# Altium integrated library GatewayRPICM5.IntLib: 39 symbols
Pins are listed as number, name and electrical type; pins without a type are passive.

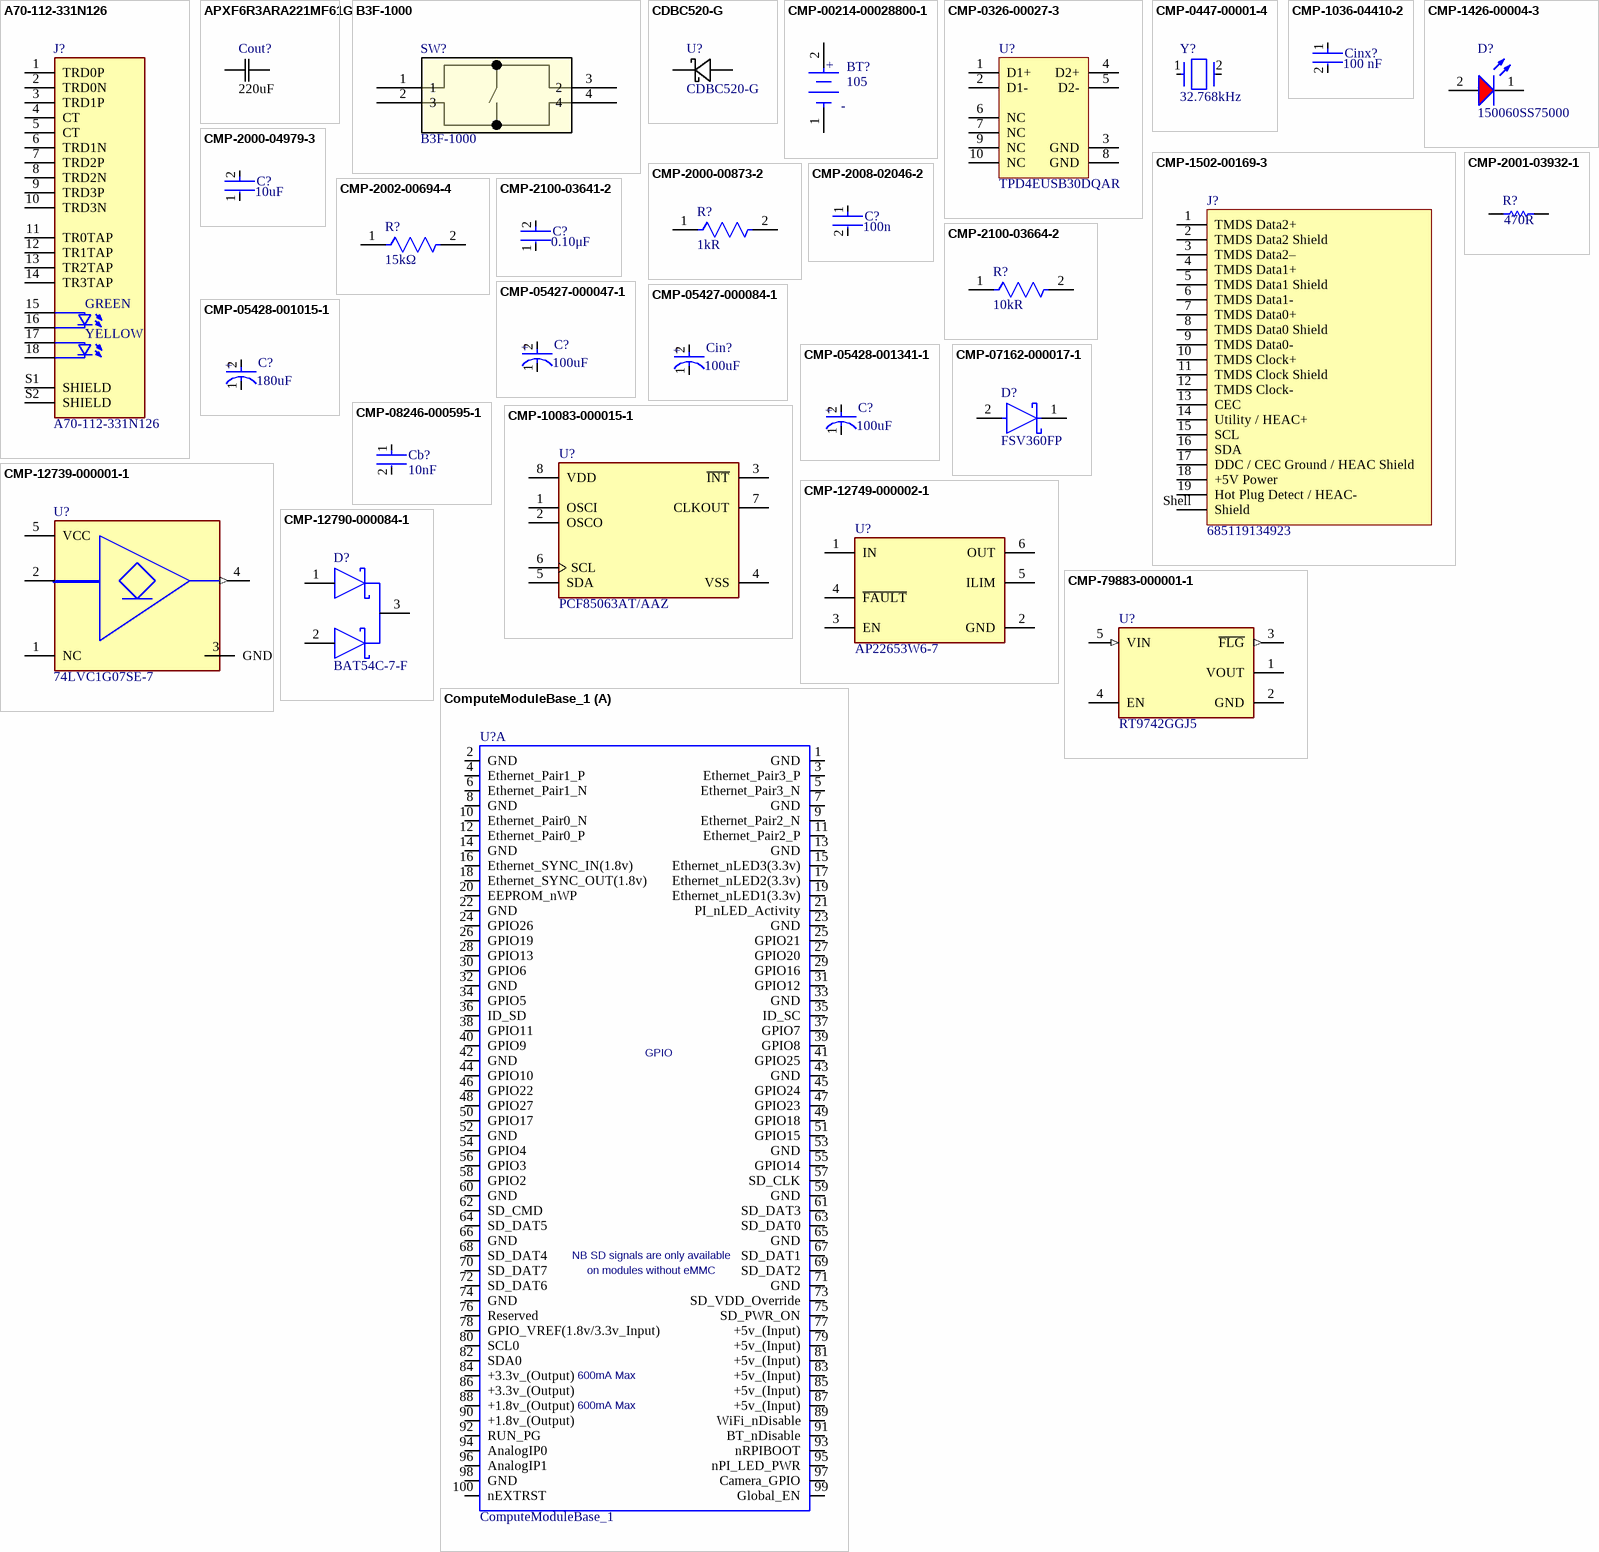
[diagram p0: symbols A70-112-331N126 to ComputeModuleBase_1]

## A70-112-331N126
designator J?
Ethernet RPI; Package: None; Availability: Unavailable; MP: A70-112-331N126; Value: *; Price: None
footprint EDAC_A70-112-331N126
pins: 1 TRD0P, 2 TRD0N, 3 TRD1P, 4 CT, 5 CT, 6 TRD1N, 7 TRD2P, 8 TRD2N, 9 TRD3P, 10 TRD3N, 11 TR0TAP, 12 TR1TAP, 13 TR2TAP, 14 TR3TAP, 15 Anode, 16 Cathode, 17 Anode, 18 Cathode, S1 SHIELD "Sheild", S2 SHIELD "Sheild"
text: GREEN; YELLOW

## APXF6R3ARA221MF61G
designator Cout?  value 220uF  (hidden comment: APXF6R3ARA221MF61G)
No Description Available; Mfr_Name: Nippon Chemi-Con
footprint CHEMI-F61
pins: 1, 2

## B3F-1000
designator SW?
No Description Available; Mfr_Name: Omron; RefDes: RefDes; Type: Type
footprint SW_B3F-1000_OMR
pins: 1, 2 3, 3 2, 4

## CDBC520-G
designator U?
No Description Available; Mfr_Name: Comchip
footprint CDBC-G
pins: 1, 2

## CMP-00214-00028800-1
designator BT?, comment 105
105 Battery Holder Coin Cell 1 Cell PC Pin PCB Through Hole Mount PBT 0.944 in. Dia; NexarPartId: 28800; Manufacturer: Keystone Electronics; Number of Contacts: 2; Number of Batteries: 1; Approvals: UL; Wire/Cable Gauge: 1AWG; Body Material: Glass, Nylon, PBT; Material: Plastic, Steel; REACH SVHC: No SVHC; Min Operating Temperature: -50°C; Lead Free: Lead Free; Height: 8.75mm; Diameter: 24mm; Termination: PC Pin; Max Operating Temperature: 145°C; Contact Material: Nickel; Number of Cells: 1; Packaging: Bulk; Contact Plating: Nickel; Mount: PCB, Through Hole; RoHS: Compliant; Manufacturer Part Number: 105
footprint FP-105-MFG (Battery Holder Coin Cell 1 Cell PC Pin PCB Through Hole Mount PBT 0.944 in. Dia)
pins: 1 -, 2 +

## CMP-0326-00027-3
designator U?, comment TPD4EUSB30DQAR
ESD Solution for Super-Speed (6 GBPS) USB 3.0 Interface, 4 Channels, -40 to +85 degC, 10-pin SON (DQA), Green (RoHS & no Sb/Br); Manufacturer: Texas Instruments; Differential Capacitance(pF): 0.05; Serial ATA / eSATA: TRUE; IO Capacitance(Typ)(pF): 0.8; IO Leakage Current(nA): 10; IEC 61000-4-2 Air-Gap(+/- kV): 8; ComponentLink3Description: URL Link1; PartNumber: TPD4EUSB30DQAR; DatasheetVersion: SLVSAC2C; ComponentLink2URL: http://www.ti.com/general/docs/lit/getliterature.tsp?genericPartNumber=TPD4EUSB30&fileType=pdf; USB Super Speed: TRUE; Eco-Plan: Green (RoHS & no Sb/Br); Mounting Technology: Surface Mount; 1394 / Firewire: TRUE; PackageVersion: revB, Sep-2009; SubFamily: ESD Solution; USB Full Speed: TRUE; USB High Speed: TRUE; ComponentLink2Description: Datasheet; ComponentLink1URL: http://www.ti.com/; IEC 61000-4-2 Contact(+/- kV): 8; Breakdown Voltage(Min)(V): 8; PackageReference: DQA0010A; ComponentLink1Description: Manufacturer URL; PackageDescription: 10-Pin Plastic Small Outline No-Lead, 1 x 2.5 x 0.55 mm Body, 0.5 mm Pitch; ComponentLink3URL: SamplesURL:http://www.ti.com/product/tpd4eusb30#samples; HDMI: TRUE; Manufacturer Part Number: TPD4EUSB30DQAR
footprint DQA0010A_V (SON, 10-Leads, Body 1x2.5mm, Pitch 0.5mm, TI Recommended)
pins: 1 D1+ "High-speed ESD clamp, provides ESD protection to the high-speed differential data line", 2 D1- "High-speed ESD clamp, provides ESD protection to the high-speed differential data line", 3 GND (power) "Ground", 4 D2+ "High-speed ESD clamp, provides ESD protection to the high-speed differential data line", 5 D2- "High-speed ESD clamp, provides ESD protection to the high-speed differential data line", 6 NC "Not normally connected", 7 NC "Not normally connected", 8 GND (power) "Ground", 9 NC "Not normally connected", 10 NC "Not normally connected"

## CMP-0447-00001-4
designator Y?, comment Frequency: 32.768kHz  (hidden comment: ABS07-32.768KHZ-T)
Crystal 32.768kHz ±20ppm (Tol) 12.5pF FUND 70kΩ 2-Pin CSMD T/R; Manufacturer: Abracon; ESR (Equivalent Series Resistance): 70kR; Radiation Hardening: No; Length: 3.2mm; Max Operating Temperature: 85°C; Number of Pins: 2; Series: ABS07; Min Operating Temperature: -40°C; Frequency Tolerance: 20ppm; Packaging: Tape and Reel; Height: 0.9mm; Width: 1.5mm; Depth: 1.5mm; Load Capacitance: 12.5pF; RoHS Compliant: Yes; Tolerance: 20ppm; Termination: SMD/SMT; Lead Free: Lead Free; Series Resistance: 70kR; REACH SVHC: No SVHC; Case/Package: CSMD; Operating Frequency: 32.768 kHz; Package Quantity: 3000; Manufacturer Part Number: ABS07-32.768KHZ-T
footprint FP-ABS07-MFG
pins: 1, 2

## CMP-1036-04410-2
designator Cinx?, comment value 100 nF  (hidden comment: CC0805KRX7R8BB104)
CAP CER 0.1UF 25V X7R 0805; Manufacturer: Yageo; Manufacturer: KEMET; Manufacturer Part Number: C0805C104K3RACTU; Manufacturer: Vishay Vitramon; Manufacturer Part Number: VJ0805Y104KXXMC; Manufacturer: Kyocera AVX; Manufacturer Part Number: 08053C104KAT2A; Manufacturer Part Number: C0805C104K3RACTM; Manufacturer Part Number: VJ0805Y104KXXAP; Manufacturer Part Number: C0805C104K3RAC; Manufacturer Part Number: VJ0805Y104KXXPW1BC; Manufacturer Part Number: VJ0805Y104KXXAC; Manufacturer: Murata; Manufacturer Part Number: GRM21BR71E104KA01L; Manufacturer: TDK; Manufacturer Part Number: C2012X7R1E104K/0.85; Manufacturer: Vishay; Manufacturer Part Number: VJ0805Y104KXXCW1BC; Manufacturer Part Number: C2012X7R1E104K/1.25; Manufacturer Part Number: 08053D104KAT2A; Manufacturer Part Number: 08053C104KAT7A; Manufacturer Part Number: CC0805KPX7R8BB104; Manufacturer Part Number: VJ0805Y104KXXMP; Manufacturer Part Number: 08053C104KAT4A; Tolerance: 0.1; ComponentLink2URL: http://www.yageo.com/documents/recent/UPY-GPHC_Y5V_6.3V-to-50V_8.pdf; Category: Cap; Mouser Description: Multilayer Ceramic Capacitors MLCC - SMD/SMT 100nF 25V X7R 10%; Manufacturer Part Number: CC0805KRX7R8BB104; Device Class L1: Passive Components; Footprint Url: http://www.yageo.com/exep/pages/download/literatures/UPY-C_GEN_24.pdf; Height: 0.95mm; Material: Ceramic; Digikey Description: CAP CER 0.1UF 25V X7R 0805; Lead Free: Yes; Temperature Range High: +85°C; Temperature: -30°C to +85°C; Ipc Land Pattern Name: CAPC200125X85; Capacitance: 100 nF; Automotive: No; Octopart: https://octopart.com/cc0805krx7r8bb104-yageo-39467766; Device Class L2: Capacitors; Temperature Characteristic: X7R; Voltage Rating: 25 V; ComponentLink2Description: Datasheet; Temperature Range Low: -30°C; Device Class L3: Ceramic Capacitors; RoHS: TRUE; Package: CC0805-0.85; Parameter 1: *
footprint FP-CC0805-0_85-MFG
footprint FP-CC0805-0_85-IPC_C
footprint FP-CC0805-0_85-IPC_B
footprint FP-CC0805-0_85-IPC_A
pins: 1, 2

## CMP-1426-00004-3
designator D?, comment 150060SS75000
Led, Red, 630 Nm, 1.9 V, 30 Ma, 60 Mcd Rohs Compliant: Yes; Manufacturer: Wurth Electronics; Dominant Wavelength: 630nm; Lens Style: Clear, Rectangular; Forward Current: 100mA; Test Current: 20mA; Viewing Angle: 140°; Forward Voltage: 1.9V; Peak Wavelength: 645nm; Max Reverse Voltage (DC): 5V; Luminous Intensity: 60mcd; Color: Red; Height: 700µm; Min Operating Temperature: -40°C; Case Code (Imperial): 0603; REACH SVHC: Unknown; RoHS: Compliant; Length: 1.6mm; Case Code (Metric): 1608; Mount: Surface Mount; Wavelength: 630nm; Packaging: Tape and Reel; Max Operating Temperature: 85°C; Width: 800µm; Case/Package: 0603; Manufacturer Part Number: 150060SS75000
footprint WL-SMCW_0603_150060xx75000
pins: 1 K, 2 A

## CMP-1502-00169-3
designator J?, comment 685119134923
NexarPartId: 18818285; Manufacturer: Wurth Electronics; Connector Type: HDMI; Contact Resistance: 30mΩ; Current Rating: 500mA; Gender: Receptacle; Insulation Resistance: 10MΩ; Number of Contacts: 19; Body Material: Plastic; Voltage Rating: 40V; REACH SVHC: Unknown; Length: 12.15mm; Orientation: Horizontal; Packaging: Tape and Reel; Number of Pins: 19; Min Operating Temperature: -25°C; Termination: SMD/SMT; Height: 5.55mm; Features: Shielded; Number of Positions: 19; Width: 15mm; Mount: Horizontal, Surface Mount; Color: Black; Contact Material: Bronze, Gold; RoHS: Compliant; Max Operating Temperature: 85°C; Manufacturer Part Number: 685119134923
footprint 685119134923 (Conn HDMI PL 19 POS 1.27mm Solder RA SMD 19 Terminal 1 Port T/R)
pins: 1 TMDS Data2+, 2 TMDS Data2 Shield, 3 TMDS Data2–, 4 TMDS Data1+, 5 TMDS Data1 Shield, 6 TMDS Data1-, 7 TMDS Data0+, 8 TMDS Data0 Shield, 9 TMDS Data0-, 10 TMDS Clock+, 11 TMDS Clock Shield, 12 TMDS Clock-, 13 CEC, 14 Utility / HEAC+, 15 SCL, 16 SDA, 17 DDC / CEC Ground / HEAC Shield, 18 +5V Power, 19 Hot Plug Detect / HEAC-, Shell Shield

## CMP-2000-00873-2
designator R?, comment Resistance: 1kR  (hidden comment: ERA-3AEB102V)
RES SMD 1K OHM 0.1% 1/10W 0603; Manufacturer: Panasonic; Temperature Coefficient: 25ppm/°C; Voltage Rating: 75V; Max Power Dissipation: 100mW; Technology: METAL FILM; Number of Pins: 2; Packaging: Tape and Reel; Case Code (Imperial): 0603; Case Code (Metric): 1608; Min Operating Temperature: -55°C; REACH SVHC: No SVHC; Length: 1.6mm; Termination: SMD/SMT; Depth: 0.8mm; Resistance Tolerance: 0.1%; Number of Terminations: 2; Width: 0.8mm; Military Standard: Not; Tolerance: 0.1%; Package Quantity: 5000; Contact Plating: Tin; Height: 0.45mm; Construction: Rectangular; Case/Package: 0603; Max Operating Temperature: 155°C; Resistor Type: Thin Film; Series: ERA-3A; Size Code: 0603; RoHS Compliant: Yes; Mount: Surface Mount; Radiation Hardening: No; Power Rating: 100mW; Manufacturer Part Number: ERA-3AEB102V
footprint FP-ERA3A-IPC_C
footprint FP-ERA3A-IPC_B
footprint FP-ERA3A-IPC_A
footprint FP-ERA3A-MFG
pins: 1, 2

## CMP-2000-04979-3
designator C?, comment Capacitance: 10uF  (hidden comment: C1608X5R1A106K080AC)
Multilayer Ceramic Capacitors 10μF ±10% 10V X5R SMD 0603; Manufacturer: TDK; Dielectric Material: Ceramic; Construction: Flat; Height: 0.8mm; Thickness: 0.035inch; Case Code (Metric): 1608; Radiation Hardening: No; Number of Pins: 2; Voltage Rating (DC): 10V; Depth: 0.8mm; Voltage: 10V; RoHS Compliant: Yes; Voltage Rating: 10V; Package Quantity: 1; Resistor Type: Ceramic; Termination: SMD/SMT; Lead Free: Lead Free; REACH SVHC: No SVHC; Tolerance: 10%; Mount: Surface Mount; Series: C; Packaging: Tape and Reel; Width: 0.8mm; Dielectric: X5R; Weight: 7.1E-05oz; Length: 1.6mm; Max Operating Temperature: 85°C; Case Code (Imperial): 0603; Case/Package: 0603; Min Operating Temperature: -55°C; Manufacturer Part Number: C1608X5R1A106K080AC
footprint FP-C1608-080-0_1-MFG
footprint FP-C1608-080-0_1-IPC_C
footprint FP-C1608-080-0_1-IPC_A
footprint FP-C1608-080-0_1-IPC_B
pins: 1, 2

## CMP-2001-03932-1
designator R?, comment value 470R  (hidden comment: CRCW0805470RFKEA)
Manufacturer: Vishay Dale; Manufacturer: Vishay; Part Number: CRCW0805470RFKEA; Manufacturer Part Number: CRCW0805470RFKEA
footprint RESC2013X50X30LL20T20 (Chip Resistor, 2-Leads, Body 2.00x1.25mm, IPC High Density)
footprint RESC2013X50X30NL20T20 (Chip Resistor, 2-Leads, Body 2.00x1.25mm, IPC Medium Density)
footprint RESC2013X50X30ML20T20 (Chip Resistor, 2-Leads, Body 2.00x1.25mm, IPC Low Density)
pins: 1, 2
1 alternate drawing of the same symbol

## CMP-2002-00694-4
designator R?, comment Resistance: 15kΩ  (hidden comment: ERJ-2RKF1502X)
RES SMD 15K OHM 1% 1/10W 0402; Manufacturer: Panasonic; Automotive Grade: Grade 0; Voltage Rating: 50V; Temperature Coefficient: 100ppm/°C; Power Rating: 0.1W; Value: 15kΩ; ComponentLink2URL: https://industrial.panasonic.com/cdbs/www-data/pdf/RDA0000/AOA0000C304.pdf; Automotive: Yes; Temperature: -55°C to +155°C; Height: 0.4mm; Digikey Description: RES SMD 15K OHM 1% 1/10W 0402; Category: Res; Device Class L2: Resistors; Device Class L1: Passive Components; Package: ERJ2R; Temperature Range Low: -55°C; Tolerance: 1%; Series: ERJ; Manufacturer Part Number: ERJ-2RKF1502X; Footprint Url: https://b2b-api.panasonic.eu/file_stream/pids/fileversion/1180; Mouser Description: Res Thick Film 1.0 x 0.5 mm 15K Ohm 1% 0.1W(1/10W) 100ppm/ C Molded SMD Punched Carrier T/R; Composition: Thick Film; Lead Free: Yes; Device Class L3: Chip SMD Resistors; Octopart: https://octopart.com/erj-2rkf1502x-panasonic-55404985; RoHS: TRUE; Temperature Range High: +155°C; ComponentLink2Description: Datasheet
footprint FP-ERJ2R-MFG
footprint FP-ERJ2R-IPC_C
footprint FP-ERJ2R-IPC_B
footprint FP-ERJ2R-IPC_A
pins: 1, 2

## CMP-2008-02046-2
designator C?, comment Capacitance: 100n  (hidden comment: C0402C104K8PACTU)
CAP CER 0.1UF 10V X5R 0402; Manufacturer: Kemet; Material: Ceramic; Temperature Coefficient: 15%; Tolerance: 0.1; Value: 0.10 μF; Package: C0402-BB; Temperature: -55°C to +125°C; ComponentLink2Description: Datasheet; Temperature Characteristic: X5R; Device Class L1: Passive Components; Height: 0.55mm; Lead Free: Yes; ComponentLink2URL: https://content.kemet.com/datasheets/KEM_C1002_X7R_SMD.pdf; Device Class L2: Capacitors; Temperature Range Low: -55°C; Temperature Range High: +125°C; RoHS: TRUE; Octopart: https://octopart.com/c0402c104k8pactu-kemet-140039; Automotive: No; Mouser Description: Capacitor 100 nF 10 VDC 0402; Category: Cap; Voltage Rating: 10 V; Digikey Description: CAP CER 0.1UF 10V X5R 0402; Ipc Land Pattern Name: CAPC10050X50; Device Class L3: Ceramic Capacitors; Manufacturer Part Number: C0402C104K8PACTU; Manufacturer: KEMET
footprint FP-C0402-BB-MFG
footprint FP-C0402-BB-IPC_C
footprint FP-C0402-BB-IPC_B
footprint FP-C0402-BB-IPC_A
pins: 1, 2

## CMP-2100-03641-2
designator C?, comment Capacitance: 0.10μF  (hidden comment: GRM155R71C104KA88D)
CAP CER 0.1UF 16V X7R 0402; Manufacturer: Murata; Standoff Height: 0mm; Tolerance: 10%; Voltage Rating: 16Vdc; Material: Ceramic; Value: 0.10μF; RoHS: TRUE; Manufacturer Part Number: GRM155R71C104KA88D; Temperature Characteristic: X7R; Octopart: https://octopart.com/grm155r71c104ka88d-murata-196880; Digikey Description: CAP CER 0.1UF 16V X7R 0402; Device Class L3: Ceramic Capacitors; Height: 0.55mm; ComponentLink2Description: Datasheet; Temperature Range Low: -55°C; Ipc Land Pattern Name: CAPC10050X219; ComponentLink2URL: https://search.murata.co.jp/Ceramy/image/img/A01X/G101/ENG/GRM155R71H471KA01-01A.pdf; Device Class L1: Passive Components; Lead Free: yes; Category: Cap; Package: GRM15; Temperature: -55°C to +125°C; Device Class L2: Capacitors; Temperature Range High: +125°C; Mouser Description: 0402 0.1 uF 16V ±10 % Tolerance X7R SMT Multilayer Ceramic Capacitor
footprint FP-GRM15-MFG
footprint FP-GRM15-IPC_C
footprint FP-GRM15-IPC_B
footprint FP-GRM15-IPC_A
pins: 1, 2

## CMP-2100-03664-2
designator R?, comment Resistance: 10kR  (hidden comment: RC0603FR-0710KL)
RES 10K OHM 1% 1/10W 0603; Manufacturer: Yageo; Voltage Rating: 75V; Voltage Rating (DC): 50V; Power Rating: 100mW; Temperature Coefficient: 100ppm/°C; Depth: 0.8mm; Termination: SMD/SMT; Resistor Type: Thick Film; Series: RC; Construction: Rectangular; Features: Moisture Resistant; Packaging: Tape and Reel; Min Operating Temperature: -55°C; Number of Terminations: 2; Lead Pitch: 0.3mm; RoHS Compliant: Yes; Case/Package: 0603; Resistance Tolerance: 1%; Military Standard: Not; Weight: 7.1E-05oz; Number of Pins: 2; Tolerance: 1%; Length: 1.6mm; Case Code (Imperial): 0603; Lead Free: Lead Free; Width: 0.8mm; Max Power Dissipation: 100mW; Height: 0.45mm; Max Operating Temperature: 155°C; Case Code (Metric): 1608; Size Code: 0603; Manufacturer Part Number: RC0603FR-0710KL
footprint FP-RC0603-0_55-IPC_C
footprint FP-RC0603-0_55-IPC_B
footprint FP-RC0603-0_55-MFG
footprint FP-RC0603-0_55-IPC_A
pins: 1, 2

## CMP-05427-000047-1
designator C?, comment Capacitance: 100uF  (hidden comment: EEE-1AA101WR)
CAP ALUM 100UF 20% 10V SMD; Manufacturer: Panasonic; Life (Hours): 1000Hour; Ripple Current: 50mA; Packaging: Tape and Reel; Diameter: 5mm; Voltage Rating (DC): 10V; Mount: Surface Mount; Max Operating Temperature: 85°C; Length: 5.5mm; Case/Package: Radial; Height: 5.4mm; Construction: Cylindrical; Termination: SMD/SMT; Height - Seated (Max): 0.213inch; Series: S; Min Operating Temperature: -40°C; Tolerance: 20%; Voltage Rating: 10V; Package Quantity: 1; Radiation Hardening: No; Ripple Current (AC): 50mA; Lead Free: Lead Free; RoHS Compliant: Yes; Contact Plating: Tin; Manufacturer Part Number: EEE-1AA101WR
footprint FP-SC-MFG
pins: 1 C, 2 A
text: +

## CMP-05427-000084-1
designator Cin?, comment Capacitance: 100uF  (hidden comment: EEE-FK1V101P)
CAP ALUM 100UF 20% 35V SMD; Manufacturer: Panasonic; Leakage Current: 3uA; ESR (Equivalent Series Resistance): 160mR; Ripple Current (AC): 600mA; Life (Hours): 2000Hour; Dielectric Material: Aluminium; RoHS Compliant: Yes; Construction: Cylindrical; REACH SVHC: No SVHC; Width: 10mm; Min Operating Temperature: -55°C; Voltage Rating (DC): 35V; Voltage: 35V; Impedance: 160mR; Ripple Current: 600mA; Lead Free: Lead Free; Packaging: Tape and Reel; Radiation Hardening: No; Mount: Surface Mount; Termination: SMD/SMT; Max Operating Temperature: 105°C; Package Quantity: 1; Length: 10.2mm; Contact Plating: Tin; Case/Package: Radial; Series: FK; Number of Pins: 2; Tolerance: 20%; Voltage Rating: 35V; Diameter: 8mm; Height: 10.2mm; Height - Seated (Max): 0.402inch; Manufacturer Part Number: EEE-FK1V101P
footprint FP-FKF-MFG
pins: 1 C, 2 A
text: +

## CMP-05428-001015-1
designator C?, comment Capacitance: 180uF  (hidden comment: 20SVPF180M)
Conductive Polymer Aluminum Solid Capacitors (OS-CON) 180uF ±20% 20V RADIAL SMT 8x6.9mm; Manufacturer: Panasonic; Polarity: Polar; Life (Hours): 5000Hour; Leakage Current: 720uA; Dissipation Factor: 12%; Ripple Current (AC): 3.2A; ESR (Equivalent Series Resistance): 25mR; Voltage: 20V; Height: 6.9mm; Length: 6.9mm; Number of Pins: 7; Packaging: Tape and Reel; Mount: Surface Mount; Lead Free: Lead Free; Max Operating Temperature: 105°C; Voltage Rating: 20V; Construction: Cylindrical; REACH SVHC: No SVHC; Diameter: 8mm; Tolerance: 20%; Package Quantity: 1000; Voltage Rating (DC): 20V; Series: OS-CON™, SVPF; Termination: SMD/SMT; Min Operating Temperature: -55°C; Ripple Current: 3.2A; RoHS Compliant: Yes; Case/Package: Radial; Height - Seated (Max): 0.276inch; Manufacturer Part Number: 20SVPF180M
footprint FP-OS-CON-SMT-E7-MFG
pins: 1 C, 2 A
text: +

## CMP-05428-001341-1
designator C?, comment Capacitance: 100uF  (hidden comment: 8TPE100MAZB)
Molded Tantalum Polymer Capacitor 100uF 20% 8V life 1000Hours SMD 1411; Manufacturer: Panasonic; Ripple Current: 1.4A; Polarity: Polar; ESR (Equivalent Series Resistance): 35mR; Leakage Current: 80uA; Dissipation Factor: 8%; Number of Pins: 2; Mount: Surface Mount; Lead Free: Lead Free; Min Operating Temperature: -55°C; Height - Seated (Max): 0.079inch; Tolerance: 20%; Voltage Rating (DC): 8V; Series: POSCAP™ TPE; RoHS Compliant: Yes; Features: General Purpose; Length: 3.5mm; Depth: 2.8mm; Termination: SMD/SMT; Height: 1.9mm; Radiation Hardening: No; Width: 2.8mm; Voltage Rating: 8V; Construction: Flat; Case/Package: Molded; Package Quantity: 2000; Voltage: 8V; Max Operating Temperature: 105°C; Case Code (Imperial): 1210; Case Code (Metric): 3528; Packaging: Tape and Reel; REACH SVHC: No SVHC; Manufacturer Part Number: 8TPE100MAZB
footprint FP-POSCAP-B2-MFG
pins: 1 C, 2 A
text: +

## CMP-07162-000017-1
designator D?, comment FSV360FP
DIODE SCHOTTKY 60V 3A SOD123HE; Manufacturer: ON Semiconductor; Manufacturer: ON Semiconductor / Fairchild; Peak Reverse Current: 100uA; Max Surge Forward Current: 80A; Max Junction Temp: +150°C; ComponentLink2URL: https://www.onsemi.jp/PowerSolutions/document/FSV360FP-D.PDF; Device Class L1: Discrete Semiconductors; RoHS: TRUE; Temperature: -55°C to +150°C; ComponentLink2Description: Datasheet; Manufacturer Part Number: FSV360FP; Height: 1mm; Octopart: https://octopart.com/fsv360fp-on+semiconductor-84328668; Device Class L2: Diodes; Forward Current: 3A; Automotive: No; Device Class L3: Schottky Diodes; Reverse Voltage: 60V; Digikey Description: DIODE SCHOTTKY 60V 3A SOD123HE; Footprint Url: https://www.onsemi.com/pub/Collateral/425AC.PDF; Package: 425AC; Mouser Description: 60V 3A Schottky Barrier Rectifier in SOD-123HE / TAPE REEL; Max Repetitive Reverse Voltage: 60V; Category: Diode; Lead Free: Yes; Temperature Range High: +150°C; Temperature Range Low: -55°C
footprint FP-425AC-MFG
pins: 1 C, 2 A

## CMP-08246-000595-1
designator Cb?, comment Capacitance: 10nF  (hidden comment: CGA4C2C0G1H103J060AA)
Cap Ceramic 10nF 50V C0G 5% Pad SMD 0805 +125°C Automotive T/R; Manufacturer: TDK; Max Operating Temperature: 125°C; Voltage Rating (DC): 50V; Packaging: Tape and Reel; Composition: Ceramic; Case/Package: 0805; REACH SVHC: No SVHC; Dielectric: C0G; Depth: 1.25mm; Min Operating Temperature: -55°C; Termination: SMD/SMT; Length: 2mm; Case Code (Metric): 2012; Thickness: 0.028inch; Ratings: AEC-Q200; Package Quantity: 1; Case Code (Imperial): 0805; Tolerance: 5%; Voltage Rating: 50V; Radiation Hardening: No; Lead Free: Lead Free; Height: 0.6mm; Mount: Surface Mount; Weight: 0.000194oz; Width: 0.049inch; Manufacturer Part Number: CGA4C2C0G1H103J060AA
footprint FP-CGA4J-IPC_B
footprint FP-CGA4J-IPC_C
footprint FP-CGA4J-IPC_A
footprint FP-CGA4J-MFG
pins: 1, 2

## CMP-10083-000015-1
designator U?, comment PCF85063AT/AAZ
IC RTC CLK/CALENDAR I2C 8SOIC; Manufacturer: NXP Semiconductors; Date Format: YY-MM-DD-dd; Time Format: HH:MM:SS (12/24 hr); RoHS Compliant: Yes; Interface: I2C; Mount: Surface Mount; Min Operating Temperature: -40°C; Lead Free: Lead Free; Packaging: Tape and Reel; Max Operating Temperature: 85°C; Case/Package: SOIC; Manufacturer Part Number: PCF85063AT/AAZ
footprint FP-SOT96-1-MFG
footprint FP-SOT96-1-IPC_B
footprint FP-SOT96-1-IPC_C
footprint FP-SOT96-1-IPC_A
pins: 1 OSCI, 2 OSCO, 3 ~{INT}, 4 VSS (power), 5 SDA, 6 SCL, 7 CLKOUT, 8 VDD (power)

## CMP-12739-000001-1
designator U?, comment 74LVC1G07SE-7
IC BUF NON-INVERT 5.5V SOT353; Manufacturer: Diodes Inc.; Manufacturer: Diodes; Number Of Outputs: 1; Standoff Height: 0mm; Propagation Delay: 1.7ns; Nominal Supply Current: 0.1uA; Min Supply Voltage: 1.65V; Max Junction Temp: +150°C; Logic Function Desc: Non-Inverting; Temperature: -40°C to +125°C; RoHS: TRUE; ComponentLink2Description: Datasheet; Category: IC; Ipc Land Pattern Name: SOT65P210X100-5; Digikey Description: IC BUF NON-INVERT 5.5V SOT353; Device Class L2: Logic ICs; Number Of Inputs: 1; Height: 1.1mm; Ambient Temperature Range High: +125°C; Lead Free: Yes; Octopart: https://octopart.com/74lvc1g07se-7-diodes+inc.-18882698; Device Class L1: Integrated Circuits (ICs); Number Of Circuits: 1; Max Supply Voltage: 5.5V; Temperature Range Low: -40°C; Manufacturer Part Number: 74LVC1G07SE-7; Device Class L3: Buffers; ComponentLink2URL: https://www.diodes.com/assets/Datasheets/74LVC1G07.pdf; Footprint Url: https://www.diodes.com/assets/Package-Files/SOT353.pdf; Temperature Range High: +125°C; Package: SOT353; Mouser Description: 74LVC Series 5.5 V Surface Mount Single Buffer with Open Drain Output - SOT-353; Automotive: No; Ambient Temperature Range Low: -40°C
footprint FP-SOT353-MFG
footprint FP-SOT353-IPC_C
footprint FP-SOT353-IPC_B
footprint FP-SOT353-IPC_A
pins: 1 NC, 2 A, 3 GND (power), 4 Y (out), 5 VCC (power)

## CMP-12749-000002-1
designator U?, comment AP22653W6-7
LOAD SWITCH,SOT26,T&R,3K; Manufacturer: Diodes; Manufacturer Part Number: AP22653W6-7
footprint FP-SOT26-MFG
footprint FP-SOT26-IPC_C
footprint FP-SOT26-IPC_B
footprint FP-SOT26-IPC_A
pins: 1 IN (power), 2 GND (power), 3 EN, 4 ~{FAULT} (oc), 5 ILIM, 6 OUT

## CMP-12790-000084-1
designator D?, comment BAT54C-7-F
DIODE ARRAY SCHOTTKY 30V SOT23-3; Manufacturer: Diodes; Max Reverse Current: 2uA; Power Dissipation: 200mW; Average Rectified Current: 200mA; Capacitance: 10pF; Peak Non-Repetitive Surge Current: 600mA; Forward Voltage: 800mV; Reverse Recovery Time: 5ns; Element Configuration: Common Cathode; Max Operating Temperature: 150°C; Max Reverse Voltage (DC): 30V; Power Rating: 200mW; Termination: SMD/SMT; REACH SVHC: No SVHC; Voltage Rating (DC): 30V; Series: -; Current Rating: 200mA; RoHS Compliant: Yes; Max Power Dissipation: 200mW; Case/Package: SOT-23; Max Repetitive Reverse Voltage (Vrrm): 30V; Width: 1.3mm; Min Operating Temperature: -65°C; Lead Free: Lead Free; Forward Current: 200mA; Number of Pins: 3; Contact Plating: Tin; Package Quantity: 3000; Length: 2.9mm; Radiation Hardening: No; Max Forward Surge Current (Ifsm): 600mA; Height: 1mm; Packaging: Tape and Reel; Mount: Surface Mount; Weight: 0.000282oz; Manufacturer Part Number: BAT54C-7-F
footprint FP-SOT23-IPC_B
footprint FP-SOT23-IPC_A
footprint FP-SOT23-IPC_C
footprint FP-SOT23-MFG
pins: 1 1 ANODE, 2 2 ANODE, 3 COMMON CATHODE

## CMP-79883-000001-1
designator U?, comment RT9742GGJ5
IC PWR SWTCH N-CHAN 1:1 TSOT23-5; Manufacturer: Richtek; Interface: On/Off; Fault Protection: Over Temperature; Max Output Current: 1A; Number of Outputs: 1; Output Configuration: High Side; On-State Resistance: 70mR; REACH SVHC: No SVHC; Number of Pins: 23; Packaging: Tape and Reel; Case/Package: SOT-23-5; RoHS Compliant: Yes; Max Operating Temperature: 85°C; Min Operating Temperature: -40°C; Manufacturer Part Number: RT9742GGJ5
footprint FP-RT9742GGJ5-IPC_C
footprint FP-RT9742GGJ5-IPC_B
footprint FP-RT9742GGJ5-IPC_A
pins: 1 VOUT (power), 2 GND (power), 3 ~{FLG} (out), 4 EN, 5 VIN (in)

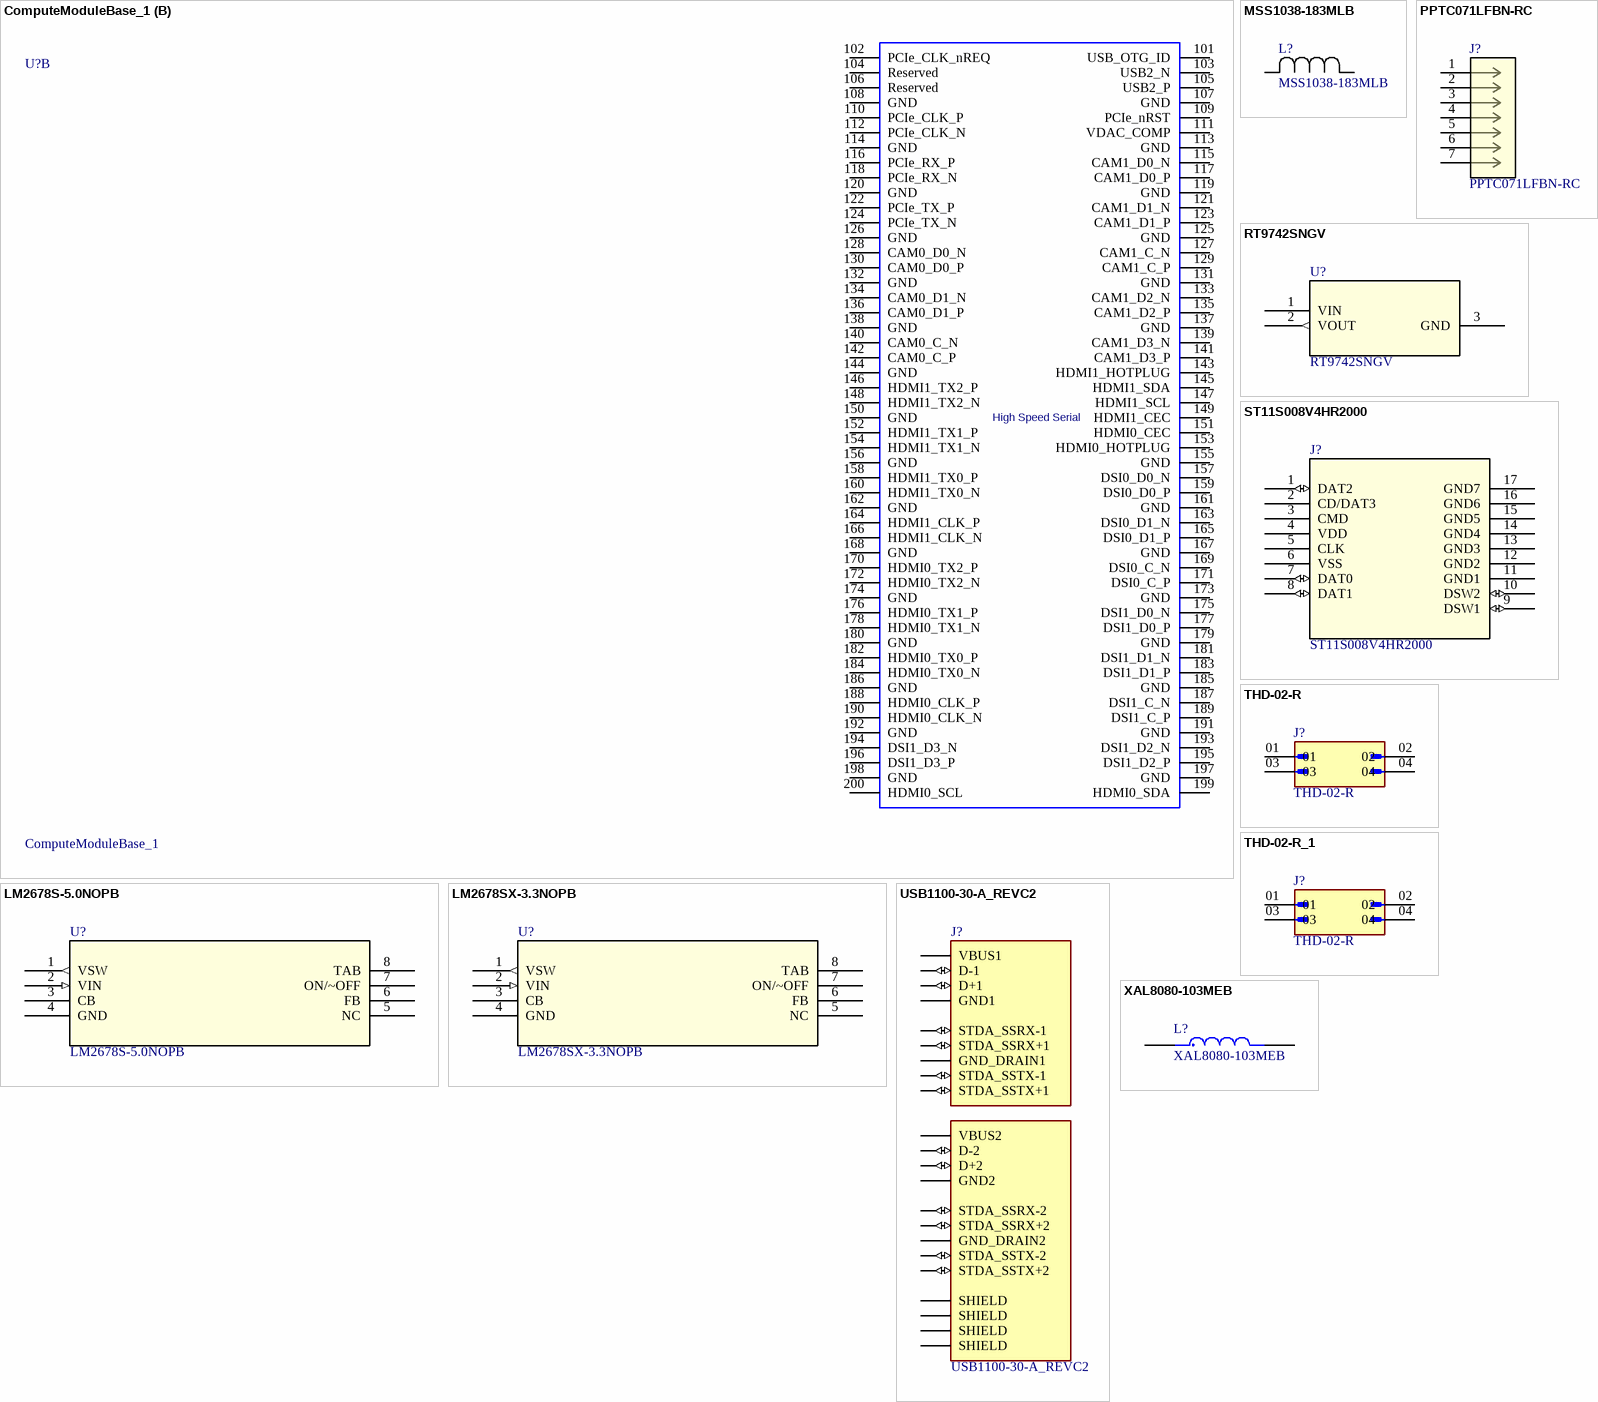
[diagram p1: symbols ComputeModuleBase_1 to XAL8080-103MEB]

## ComputeModuleBase_1
designator U?
Compute Module Holder
footprint Raspberry-Pi-Compute-Module (Compute Module Base)
part A pins: 1 GND, 2 GND, 3 Ethernet_Pair3_P, 4 Ethernet_Pair1_P, 5 Ethernet_Pair3_N, 6 Ethernet_Pair1_N, 7 GND, 8 GND, 9 Ethernet_Pair2_N, 10 Ethernet_Pair0_N, 11 Ethernet_Pair2_P, 12 Ethernet_Pair0_P, 13 GND, 14 GND, 15 Ethernet_nLED3(3.3v), 16 Ethernet_SYNC_IN(1.8v), 17 Ethernet_nLED2(3.3v), 18 Ethernet_SYNC_OUT(1.8v), 19 Ethernet_nLED1(3.3v), 20 EEPROM_nWP, 21 PI_nLED_Activity, 22 GND, 23 GND, 24 GPIO26, 25 GPIO21, 26 GPIO19, 27 GPIO20, 28 GPIO13, 29 GPIO16, 30 GPIO6, 31 GPIO12, 32 GND, 33 GND, 34 GPIO5, 35 ID_SC, 36 ID_SD, 37 GPIO7, 38 GPIO11, 39 GPIO8, 40 GPIO9, 41 GPIO25, 42 GND, 43 GND, 44 GPIO10, 45 GPIO24, 46 GPIO22, 47 GPIO23, 48 GPIO27, 49 GPIO18, 50 GPIO17, 51 GPIO15, 52 GND, 53 GND, 54 GPIO4, 55 GPIO14, 56 GPIO3, 57 SD_CLK, 58 GPIO2, 59 GND, 60 GND, 61 SD_DAT3, 62 SD_CMD, 63 SD_DAT0, 64 SD_DAT5, 65 GND, 66 GND, 67 SD_DAT1, 68 SD_DAT4, 69 SD_DAT2, 70 SD_DAT7, 71 GND, 72 SD_DAT6, 73 SD_VDD_Override, 74 GND, 75 SD_PWR_ON, 76 Reserved, 77 +5v_(Input), 78 GPIO_VREF(1.8v/3.3v_Input), 79 +5v_(Input), 80 SCL0, 81 +5v_(Input), 82 SDA0, 83 +5v_(Input), 84 +3.3v_(Output), 85 +5v_(Input), 86 +3.3v_(Output), 87 +5v_(Input), 88 +1.8v_(Output), 89 WiFi_nDisable, 90 +1.8v_(Output), 91 BT_nDisable, 92 RUN_PG, 93 nRPIBOOT, 94 AnalogIP0, 95 nPI_LED_PWR, 96 AnalogIP1, 97 Camera_GPIO, 98 GND, 99 Global_EN, 100 nEXTRST
part B pins: 101 USB_OTG_ID, 102 PCIe_CLK_nREQ, 103 USB2_N, 104 Reserved, 105 USB2_P, 106 Reserved, 107 GND, 108 GND, 109 PCIe_nRST, 110 PCIe_CLK_P, 111 VDAC_COMP, 112 PCIe_CLK_N, 113 GND, 114 GND, 115 CAM1_D0_N, 116 PCIe_RX_P, 117 CAM1_D0_P, 118 PCIe_RX_N, 119 GND, 120 GND, 121 CAM1_D1_N, 122 PCIe_TX_P, 123 CAM1_D1_P, 124 PCIe_TX_N, 125 GND, 126 GND, 127 CAM1_C_N, 128 CAM0_D0_N, 129 CAM1_C_P, 130 CAM0_D0_P, 131 GND, 132 GND, 133 CAM1_D2_N, 134 CAM0_D1_N, 135 CAM1_D2_P, 136 CAM0_D1_P, 137 GND, 138 GND, 139 CAM1_D3_N, 140 CAM0_C_N, 141 CAM1_D3_P, 142 CAM0_C_P, 143 HDMI1_HOTPLUG, 144 GND, 145 HDMI1_SDA, 146 HDMI1_TX2_P, 147 HDMI1_SCL, 148 HDMI1_TX2_N, 149 HDMI1_CEC, 150 GND, 151 HDMI0_CEC, 152 HDMI1_TX1_P, 153 HDMI0_HOTPLUG, 154 HDMI1_TX1_N, 155 GND, 156 GND, 157 DSI0_D0_N, 158 HDMI1_TX0_P, 159 DSI0_D0_P, 160 HDMI1_TX0_N, 161 GND, 162 GND, 163 DSI0_D1_N, 164 HDMI1_CLK_P, 165 DSI0_D1_P, 166 HDMI1_CLK_N, 167 GND, 168 GND, 169 DSI0_C_N, 170 HDMI0_TX2_P, 171 DSI0_C_P, 172 HDMI0_TX2_N, 173 GND, 174 GND, 175 DSI1_D0_N, 176 HDMI0_TX1_P, 177 DSI1_D0_P, 178 HDMI0_TX1_N, 179 GND, 180 GND, 181 DSI1_D1_N, 182 HDMI0_TX0_P, 183 DSI1_D1_P, 184 HDMI0_TX0_N, 185 GND, 186 GND, 187 DSI1_C_N, 188 HDMI0_CLK_P, 189 DSI1_C_P, 190 HDMI0_CLK_N, 191 GND, 192 GND, 193 DSI1_D2_N, 194 DSI1_D3_N, 195 DSI1_D2_P, 196 DSI1_D3_P, 197 GND, 198 GND, 199 HDMI0_SDA, 200 HDMI0_SCL
part A text: GPIO; NB SD signals are only available; on modules without eMMC; 600mA Max
part B text: High Speed Serial

## LM2678S-5.0NOPB
designator U?
No Description Available; Mfr_Name: Texas Instruments; Type: LM2678S-12; RefDes: RefDes
footprint TS7B
pins: 1 VSW (out), 2 VIN (in), 3 CB, 4 GND, 5 NC, 6 FB, 7 ON/~OFF, 8 TAB

## LM2678SX-3.3NOPB
designator U?
No Description Available; Mfr_Name: Texas Instruments; Type: LM2678S-12; RefDes: RefDes
footprint TS7B
pins: 1 VSW (out), 2 VIN (in), 3 CB, 4 GND, 5 NC, 6 FB, 7 ON/~OFF, 8 TAB

## MSS1038-183MLB
designator L?
No Description Available; Mfr_Name: Coilcraft
footprint IND_MSS1038_COC
pins: 1, 2

## PPTC071LFBN-RC
designator J?
No Description Available; Mfr_Name: Sullins; RefDes: RefDes; Type: Type
footprint CONN_xPxC071LFBN-RC_SUL
pins: 1, 2, 3, 4, 5, 6, 7

## RT9742SNGV
designator U?
HDMI Power; Mfr_Name: Richtek Technology; RefDes: RefDes; Type: Type
footprint SOT_42SNGV_RIT
footprint SOT_42SNGV_RIT-L
footprint SOT_42SNGV_RIT-M
pins: 1 VIN, 2 VOUT (out), 3 GND (power)

## ST11S008V4HR2000
designator J?
SD Card; Mfr_Name: JAE Electronics; RefDes: RefDes; Type: Type
footprint ST11S008V4HR2000_JAE
pins: 1 DAT2 (io), 2 CD/DAT3, 3 CMD, 4 VDD (power), 5 CLK, 6 VSS (power), 7 DAT0 (io), 8 DAT1 (io), 9 DSW1 (io), 10 DSW2 (io), 11 GND1 (power), 12 GND2 (power), 13 GND3 (power), 14 GND4 (power), 15 GND5 (power), 16 GND6 (power), 17 GND7 (power)

## THD-02-R
designator J?
THD - Valcon 2.54mm Pitch Dual Row Pin Header - Fast Stock; Check_prices: https://www.snapeda.com/parts/THD-02-R/Valcon/view-part/4777189/?ref=eda; Package: None; Purchase-URL: https://pricing.snapeda.com/search/part/THD-02-R/?ref=eda; MP: THD-02-R; Value: *; Availability: No availability data; SnapEDA_Link: https://www.snapeda.com/parts/THD-02-R/Valcon/view-part/4777189/?ref=snap; Price: None; MF: Valcon
footprint VALCON_THD-02-R (4 Pins Header for Ethernet)
pins: 01, 02, 03, 04

## THD-02-R_1
designator J?, comment THD-02-R
THD - Valcon 2.54mm Pitch Dual Row Pin Header - Fast Stock; Check_prices: https://www.snapeda.com/parts/THD-02-R/Valcon/view-part/4777189/?ref=eda; Package: None; Purchase-URL: https://pricing.snapeda.com/search/part/THD-02-R/?ref=eda; MP: THD-02-R; Value: *; Availability: No availability data; SnapEDA_Link: https://www.snapeda.com/parts/THD-02-R/Valcon/view-part/4777189/?ref=snap; Price: None; MF: Valcon
footprint VALCON_THD-02-R (4 Pins Header for Ethernet)
pins: 01, 02, 03, 04

## USB1100-30-A_REVC2
designator J?
USB-A (USB TYPE-A), Stacked USB 3.2 Gen 1 (USB 3.1 Gen 1, Superspeed (USB 3.0)) Receptacle Connector 18 Position Through Hole, Right Angle; MF: Global Connector Technology; SnapEDA_Link: https://www.snapeda.com/parts/USB1100-30-A/Global+Connector+Technology/view-part/?ref=snap; Purchase-URL: https://pricing.snapeda.com/search/part/USB1100-30-A/?ref=eda; Package: None; Value: *; MP: USB1100-30-A; Check_prices: https://www.snapeda.com/parts/USB1100-30-A/Global+Connector+Technology/view-part/?ref=eda; Availability: In Stock; Price: None
footprint GCT_USB1100-30-A_REVC2
pins: 1 VBUS1 (power), 2 D-1 (io), 3 D+1 (io), 4 GND1 (power), 5 STDA_SSRX-1 (io), 6 STDA_SSRX+1 (io), 7 GND_DRAIN1 (power), 8 STDA_SSTX-1 (io), 9 STDA_SSTX+1 (io), 10 VBUS2 (power), 11 D-2 (io), 12 D+2 (io), 13 GND2 (power), 14 STDA_SSRX-2 (io), 15 STDA_SSRX+2 (io), 16 GND_DRAIN2 (power), 17 STDA_SSTX-2 (io), 18 STDA_SSTX+2 (io), SH1 SHIELD, SH2 SHIELD, SH3 SHIELD, SH4 SHIELD

## XAL8080-103MEB
designator L?
Value: *; Availability: Unavailable; Price: None; MP: XAL8080-103MEB; Package: None
footprint IND_XAL8080-103MEB
pins: 1, 2